# Altium footprint library PCB-PCEIOT.PcbLib: 119 footprints (part 1 of 8)
Each footprint in its own frame and in the unit in brackets; x right, y up, seen from the top. Pads: shape width x height; smd on the part's side, far side on the other; paste and mask are expansions set on the pad; w line width, h text height; cw(c..) or ccw(c..) is an arc to the next point about the centre after c.
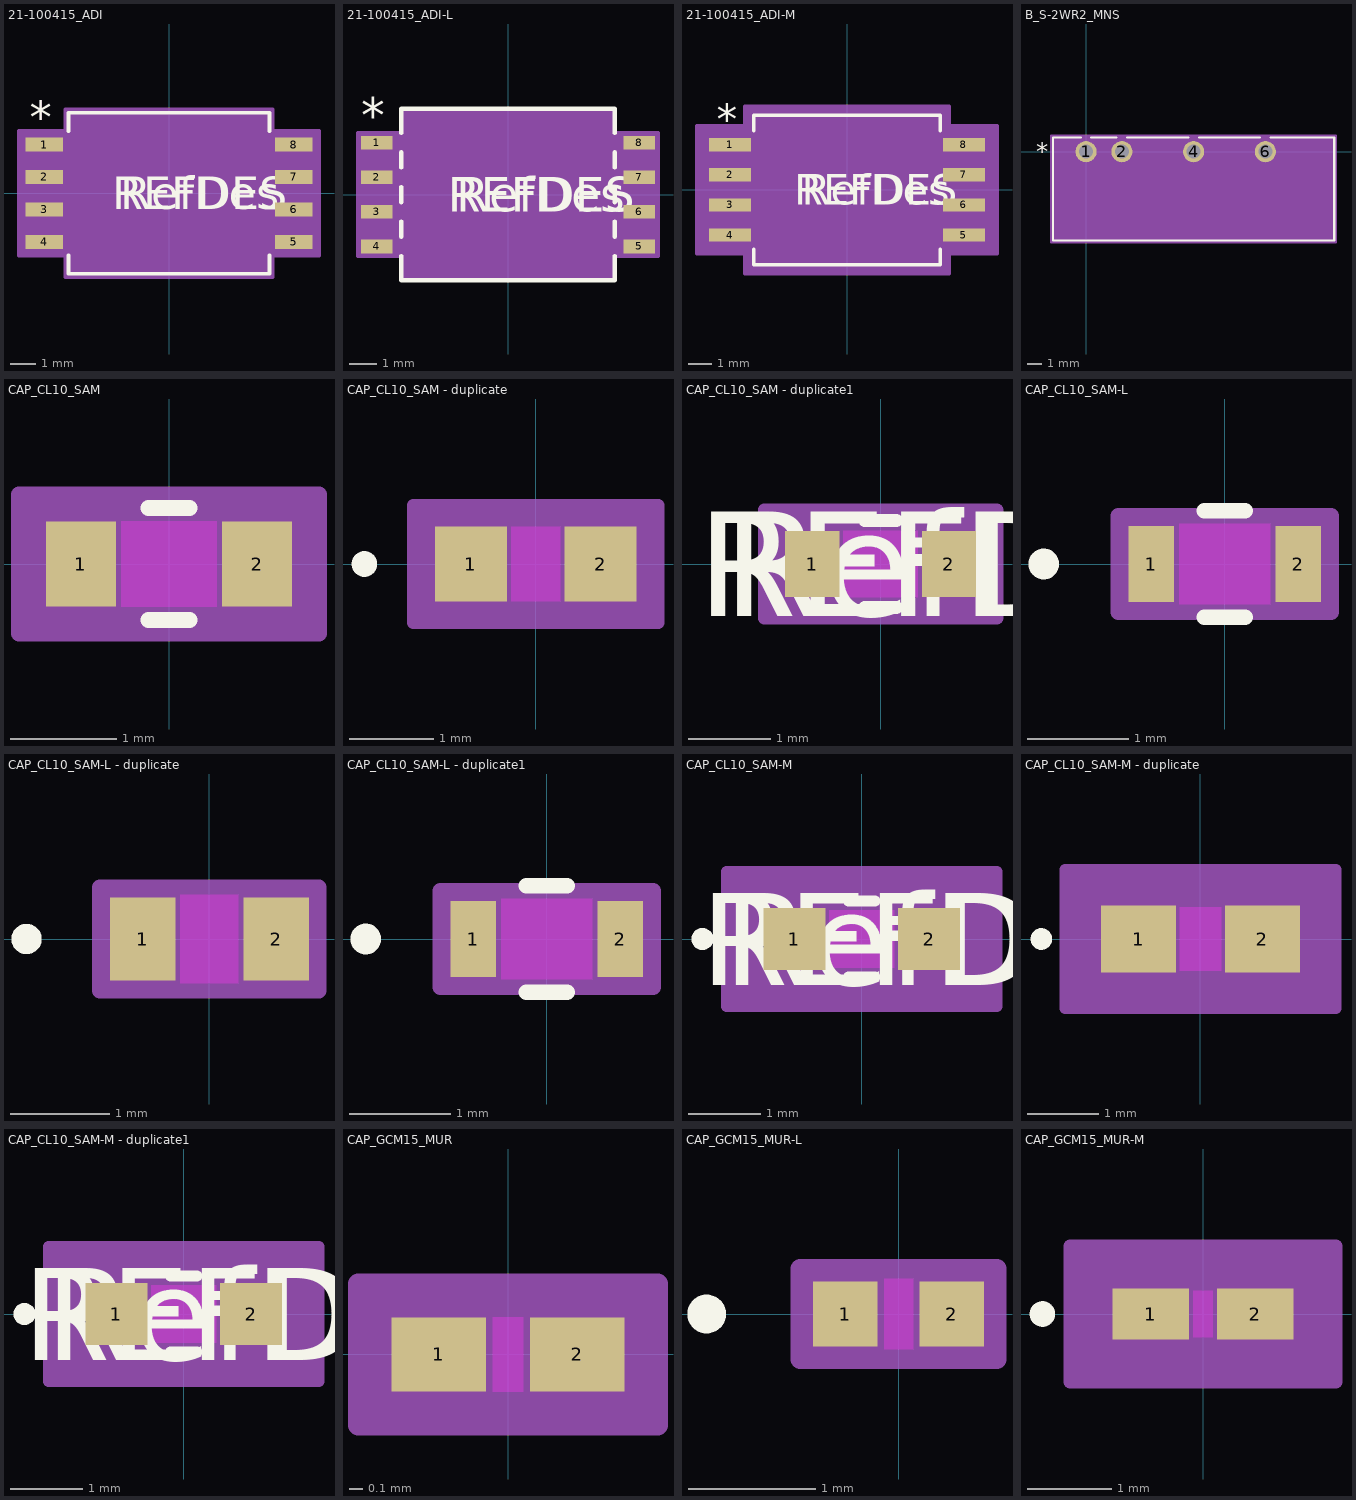
[diagram p0: the footprints below, top view; thin cyan lines are the x and y axes]

## 21-100415_ADI [mil]
pads (8):
  rect 58x22 smd paste+0 mask+0: 1(-192,75) 2(-192,25) 3(-192,-25) 4(-192,-75) 5(192,-75) 6(192,-25) 7(192,25) 8(192,75)
Top Overlay:
  lines w6: -154.5,-95.97 -154.5,-124 154.5,-124 154.5,-95.97 ; -154.5,95.97 -154.5,124 154.5,124 154.5,95.97
  text "RefDes" at -75,-25 h50
  text "*" at -214.5,92 h50
  text "REFDES" at -87.5,-25 h50
Mechanical 13:
  lines w0: -12,119 ccw(c0,119) 12,119
  lines w1: -207,-85 -149.5,-85 -149.5,-65 -207,-65 -207,-85 ; -207,-35 -149.5,-35 -149.5,-15 -207,-15 -207,-35 ; -207,15 -149.5,15 -149.5,35 -207,35 -207,15 ; -207,65 -149.5,65 -149.5,85 -207,85 -207,65 ; -149.5,-119 -149.5,119 149.5,119 149.5,-119 -149.5,-119 ; 149.5,-85 207,-85 207,-65 149.5,-65 149.5,-85 ; 149.5,-35 207,-35 207,-15 149.5,-15 149.5,-35 ; 149.5,15 207,15 207,35 149.5,35 149.5,15 ; 149.5,65 207,65 207,85 149.5,85 149.5,65
  text "RefDes2" at -87.5,-25 h50
  text "*" at -147,66 h50
Mechanical 15:
  region: -159.5,-96 -231,-96 -231,96 -159.5,96 -159.5,129 159.5,129 159.5,96 231,96 231,-96 159.5,-96 159.5,-129 -159.5,-129
  lines w6: -231,-96 -159.5,-96 -159.5,-129 159.5,-129 159.5,-96 231,-96 231,96 159.5,96 159.5,129 -159.5,129 -159.5,96 -231,96 -231,-96
3D body "21-100415_ADI.step": height 104.09, standoff 0, extent -207.01,-119.02 207.01,119.02

## 21-100415_ADI-L [mil]
pads (8):
  rect 46x20 smd paste+0 mask+0: 1(-190,75) 2(-190,25) 3(-190,-25) 4(-190,-75) 5(190,-75) 6(190,-25) 7(190,25) 8(190,75)
Top Overlay:
  lines w6: -154.5,-88.92 -154.5,-124 154.5,-124 154.5,-88.92 ; -154.5,-61.08 -154.5,-38.92 ; -154.5,-11.08 -154.5,11.08 ; -154.5,38.92 -154.5,61.08 ; -154.5,88.92 -154.5,124 154.5,124 154.5,88.92 ; 154.5,-61.08 154.5,-38.92 ; 154.5,-11.08 154.5,11.08 ; 154.5,38.92 154.5,61.08
  text "RefDes" at -75,-25 h50
  text "*" at -212.5,90 h50
  text "REFDES" at -87.5,-25 h50
Mechanical 13:
  lines w0: -12,119 ccw(c0,119) 12,119
  lines w1: -207,-85 -149.5,-85 -149.5,-65 -207,-65 -207,-85 ; -207,-35 -149.5,-35 -149.5,-15 -207,-15 -207,-35 ; -207,15 -149.5,15 -149.5,35 -207,35 -207,15 ; -207,65 -149.5,65 -149.5,85 -207,85 -207,65 ; -149.5,-119 -149.5,119 149.5,119 149.5,-119 -149.5,-119 ; 149.5,-85 207,-85 207,-65 149.5,-65 149.5,-85 ; 149.5,-35 207,-35 207,-15 149.5,-15 149.5,-35 ; 149.5,15 207,15 207,35 149.5,35 149.5,15 ; 149.5,65 207,65 207,85 149.5,85 149.5,65
  text "RefDes2" at -87.5,-25 h50
  text "*" at -147,66 h50
Mechanical 15:
  region: -153.5,-89 -217,-89 -217,89 -153.5,89 -153.5,123 153.5,123 153.5,89 217,89 217,-89 153.5,-89 153.5,-123 -153.5,-123
  lines w6: -217,-89 -153.5,-89 -153.5,-123 153.5,-123 153.5,-89 217,-89 217,89 153.5,89 153.5,123 -153.5,123 -153.5,89 -217,89 -217,-89
3D body "21-100415_ADI.step": height 104.09, standoff 0, extent -207.01,-119.02 207.01,119.02

## 21-100415_ADI-M [mil]
pads (8):
  rect 70x22 smd paste+0 mask+0: 1(-194,75) 2(-194,25) 3(-194,-25) 4(-194,-75) 5(194,-75) 6(194,-25) 7(194,25) 8(194,75)
Top Overlay:
  lines w6: -154.5,-98.3 -154.5,-124 154.5,-124 154.5,-98.3 ; -154.5,98.3 -154.5,124 154.5,124 154.5,98.3
  text "REFDES" at -87.5,-25 h50
  text "*" at -216.5,92 h50
  text "RefDes" at -75,-25 h50
Mechanical 13:
  lines w0: -12,119 ccw(c0,119) 12,119
  lines w1: -207,-85 -207,-65 -149.5,-65 -149.5,-85 -207,-85 ; -207,-35 -207,-15 -149.5,-15 -149.5,-35 -207,-35 ; -207,15 -207,35 -149.5,35 -149.5,15 -207,15 ; -207,65 -207,85 -149.5,85 -149.5,65 -207,65 ; -149.5,-119 149.5,-119 149.5,119 -149.5,119 -149.5,-119 ; 149.5,-85 149.5,-65 207,-65 207,-85 149.5,-85 ; 149.5,-35 149.5,-15 207,-15 207,-35 149.5,-35 ; 149.5,15 149.5,35 207,35 207,15 149.5,15 ; 149.5,65 149.5,85 207,85 207,65 149.5,65
  text "*" at -147,66 h50
  text "RefDes2" at -87.5,-25 h50
Mechanical 15:
  region: -169.5,-106 -249,-106 -249,106 -169.5,106 -169.5,139 169.5,139 169.5,106 249,106 249,-106 169.5,-106 169.5,-139 -169.5,-139
  lines w6: -249,-106 -249,106 -169.5,106 -169.5,139 169.5,139 169.5,106 249,106 249,-106 169.5,-106 169.5,-139 -169.5,-139 -169.5,-106 -249,-106
3D body "21-100415_ADI.step": height 104.09, standoff 0, extent -207.01,-119.02 207.01,119.02

## B_S-2WR2_MNS [mil]
pads (4):
  round 59 hole 39 paste-99999 mask+0: 1(0,0) 2(100,0) 4(300,0) 6(500,0)
Top Overlay:
  lines w6: -14.65,40 -92,40 -92,-248 692,-248 692,40 514.65,40 ; 14.65,40 85.35,40 ; 114.65,40 285.35,40 ; 314.65,40 485.35,40
  text "*" at -139.5,-25 h50
  text ".Designator" at 162.5,-129 h50
Mechanical 13:
  lines w1: -87,-243 687,-243 687,35 -87,35 -87,-243
  text ".Designator" at 162.5,-129 h50
  text "*" at -89.5,-25 h50
Mechanical 15:
  region: 697,-253 -97,-253 -97,45 697,45
  lines w6: -97,-253 -97,45 697,45 697,-253 -97,-253
3D body "B_S-2WR2_MNS.step": height 400, standoff -215.98, extent -87.01,-233.03 687.01,45

## CAP_CL10_SAM [mm]
pads (2):
  rect 0.656x0.8 smd paste+0 mask+0: 1(-0.828,0) 2(0.828,0)
Top Layer keep-out:
  region: -0.449,-0.349 -0.449,0.349 0.449,0.349 0.449,-0.349
Top Overlay:
  lines w0.152: -0.192,-0.527 0.192,-0.527 ; -0.192,0.527 0.192,0.527
  text ".Designator" at -1.46,-0.254 h1.27
Keep-Out Layer:
  region: -0.449,-0.4 -0.449,0.4 0.449,0.4 0.449,-0.4
Mechanical 13:
  lines w0.025: -0.8,-0.4 -0.8,0.4 ; -0.8,-0.4 -0.5,-0.4 -0.5,0.4 -0.8,0.4 ; -0.8,-0.4 0.8,-0.4 ; -0.8,-0.4 -0.8,0.4 ; -0.8,0.4 0.8,0.4 ; 0.8,-0.4 0.5,-0.4 0.5,0.4 0.8,0.4 ; 0.8,-0.4 0.8,0.4 ; 0.8,-0.4 0.8,0.4
Mechanical 15:
  region: 1.41,-0.654 -1.41,-0.654 -1.41,0.654 1.41,0.654
  lines w0.152: -1.41,-0.654 -1.41,0.654 1.41,0.654 1.41,-0.654 -1.41,-0.654
3D body "CAP_CL10_SAM.step": height 0.9, standoff 0, extent -0.8,-0.4 0.8,0.4

## CAP_CL10_SAM - duplicate [mil]
pads (2):
  rect 33.78x35 smd paste+0 mask+0: 1(-30.39,0) 2(30.39,0)
Top Layer keep-out:
  region: -11.5,-15.5 -11.5,15.5 11.5,15.5 11.5,-15.5
Top Overlay:
  circle w6: c-80.28,0 r3
  text ".Designator" at -137.5,-25 h50
Keep-Out Layer:
  region: -11.5,-17.5 -11.5,17.5 11.5,17.5 11.5,-17.5
Mechanical 13:
  circle w1: c-25.39,0 r3
  lines w1: -33.5,-17.5 -33.5,17.5 ; -33.5,-17.5 33.5,-17.5 ; -33.5,-17.5 -13.5,-17.5 -13.5,17.5 -33.5,17.5 ; -33.5,-17.5 -33.5,17.5 ; -33.5,17.5 33.5,17.5 ; 33.5,-17.5 33.5,17.5 ; 33.5,-17.5 33.5,17.5 ; 33.5,-17.5 13.5,-17.5 13.5,17.5 33.5,17.5
  text ".Designator" at -137.5,-25 h50
Mechanical 15:
  region: 57.28,-27.5 -57.28,-27.5 -57.28,27.5 57.28,27.5
  lines w6: -57.28,-27.5 57.28,-27.5 57.28,27.5 -57.28,27.5 -57.28,-27.5
3D body "CAP_CL10_SAM.step": height 35, standoff 0, extent -33.5,-17.48 33.5,17.48

## CAP_CL10_SAM - duplicate1 [mm]
pads (2):
  rect 0.656x0.8 smd paste+0 mask+0: 1(-0.828,0) 2(0.828,0)
Top Layer keep-out:
  region: -0.449,-0.349 -0.449,0.349 0.449,0.349 0.449,-0.349
Top Overlay:
  lines w0.152: -0.192,-0.527 0.192,-0.527 ; -0.192,0.527 0.192,0.527
  text "RefDes" at -1.905,-0.635 h1.27
  text "REFDES" at -2.222,-0.635 h1.27
Keep-Out Layer:
  region: -0.449,-0.4 -0.449,0.4 0.449,0.4 0.449,-0.4
Mechanical 13:
  lines w0.025: -0.8,-0.4 -0.8,0.4 ; -0.8,-0.4 -0.5,-0.4 -0.5,0.4 -0.8,0.4 ; -0.8,-0.4 0.8,-0.4 ; -0.8,-0.4 -0.8,0.4 ; -0.8,0.4 0.8,0.4 ; 0.8,-0.4 0.5,-0.4 0.5,0.4 0.8,0.4 ; 0.8,-0.4 0.8,0.4 ; 0.8,-0.4 0.8,0.4
  text "RefDes2" at -2.222,-0.635 h1.27
Mechanical 15:
  region: 1.41,-0.654 -1.41,-0.654 -1.41,0.654 1.41,0.654
  lines w0.152: -1.41,-0.654 -1.41,0.654 1.41,0.654 1.41,-0.654 -1.41,-0.654
3D body "CAP_CL10_SAM.step": height 0.9, standoff 0, extent -0.8,-0.4 0.8,0.4

## CAP_CL10_SAM-L [mm]
pads (2):
  rect 0.452x0.749 smd paste+0 mask+0: 1(-0.726,0) 2(0.726,0)
Top Layer keep-out:
  region: -0.449,-0.349 -0.449,0.349 0.449,0.349 0.449,-0.349
Top Overlay:
  circle w0.152: c-1.791,0 r0.076
  lines w0.152: -0.204,-0.527 0.204,-0.527 ; -0.204,0.527 0.204,0.527
  text ".Designator" at -1.016,-0.254 h0.64
Keep-Out Layer:
  region: -0.449,-0.4 -0.449,0.4 0.449,0.4 0.449,-0.4
Mechanical 13:
  circle w0: c-0.599,0 r0.076
  lines w0.025: -0.8,-0.4 -0.8,0.4 ; -0.8,-0.4 0.8,-0.4 ; -0.8,-0.4 -0.5,-0.4 -0.5,0.4 -0.8,0.4 ; -0.8,-0.4 -0.8,0.4 ; -0.8,0.4 0.8,0.4 ; 0.8,-0.4 0.8,0.4 ; 0.8,-0.4 0.8,0.4 ; 0.8,-0.4 0.5,-0.4 0.5,0.4 0.8,0.4
Mechanical 15:
  region: 1.054,-0.476 -1.054,-0.476 -1.054,0.476 1.054,0.476
  lines w0.152: -1.054,-0.476 1.054,-0.476 1.054,0.476 -1.054,0.476 -1.054,-0.476
3D body "CAP_CL10_SAM.step": height 0.9, standoff 0, extent -0.8,-0.4 0.8,0.4

## CAP_CL10_SAM-L - duplicate [mm]
pads (2):
  rect 0.658x0.839 smd paste+0 mask+0: 1(-0.672,0) 2(0.672,0)
Top Layer keep-out:
  region: -0.292,-0.394 -0.292,0.394 0.292,0.394 0.292,-0.394
Top Overlay:
  circle w0.152: c-1.839,0 r0.076
  text ".Designator" at -3.492,-0.635 h1.27
Keep-Out Layer:
  region: -0.292,-0.445 -0.292,0.445 0.292,0.445 0.292,-0.445
Mechanical 13:
  circle w0.025: c-0.545,0 r0.076
  lines w0.025: -0.851,-0.445 -0.851,0.445 ; -0.851,-0.445 -0.343,-0.445 -0.343,0.445 -0.851,0.445 ; -0.851,-0.445 0.851,-0.445 ; -0.851,-0.445 -0.851,0.445 ; -0.851,0.445 0.851,0.445 ; 0.851,-0.445 0.343,-0.445 0.343,0.445 0.851,0.445 ; 0.851,-0.445 0.851,0.445 ; 0.851,-0.445 0.851,0.445
  text ".Designator" at -3.492,-0.635 h1.27
Mechanical 15:
  region: 1.102,-0.521 -1.102,-0.521 -1.102,0.521 1.102,0.521
  lines w0.152: -1.102,-0.521 -1.102,0.521 1.102,0.521 1.102,-0.521 -1.102,-0.521
3D body "CAP_CL10_SAM.step": height 0.89, standoff 0, extent -0.851,-0.444 0.851,0.444

## CAP_CL10_SAM-L - duplicate1 [mm]
pads (2):
  rect 0.452x0.749 smd paste+0 mask+0: 1(-0.726,0) 2(0.726,0)
Top Layer keep-out:
  region: -0.449,-0.349 -0.449,0.349 0.449,0.349 0.449,-0.349
Top Overlay:
  circle w0.152: c-1.791,0 r0.076
  lines w0.152: -0.204,-0.527 0.204,-0.527 ; -0.204,0.527 0.204,0.527
Keep-Out Layer:
  region: -0.449,-0.4 -0.449,0.4 0.449,0.4 0.449,-0.4
Mechanical 13:
  circle w0: c-0.599,0 r0.076
  lines w0.025: -0.8,-0.4 -0.8,0.4 ; -0.8,-0.4 -0.5,-0.4 -0.5,0.4 -0.8,0.4 ; -0.8,-0.4 0.8,-0.4 ; -0.8,-0.4 -0.8,0.4 ; -0.8,0.4 0.8,0.4 ; 0.8,-0.4 0.5,-0.4 0.5,0.4 0.8,0.4 ; 0.8,-0.4 0.8,0.4 ; 0.8,-0.4 0.8,0.4
Mechanical 15:
  region: 1.054,-0.476 -1.054,-0.476 -1.054,0.476 1.054,0.476
  lines w0.152: -1.054,-0.476 -1.054,0.476 1.054,0.476 1.054,-0.476 -1.054,-0.476
3D body "CAP_CL10_SAM.step": height 0.9, standoff 0, extent -0.8,-0.4 0.8,0.4

## CAP_CL10_SAM-M [mm]
pads (2):
  rect 0.859x0.851 smd paste+0 mask+0: 1(-0.929,0) 2(0.929,0)
Top Layer keep-out:
  region: -0.449,-0.349 -0.449,0.349 0.449,0.349 0.449,-0.349
Top Overlay:
  circle w0.152: c-2.197,0 r0.076
  lines w0.152: -0.183,-0.527 0.183,-0.527 ; -0.183,0.527 0.183,0.527
  text "REFDES" at -2.222,-0.635 h1.27
  text "RefDes" at -1.905,-0.635 h1.27
Keep-Out Layer:
  region: -0.449,-0.4 -0.449,0.4 0.449,0.4 0.449,-0.4
Mechanical 13:
  circle w0: c-0.802,0 r0.076
  lines w0.025: -0.8,-0.4 -0.8,0.4 ; -0.8,-0.4 0.8,-0.4 ; -0.8,-0.4 -0.5,-0.4 -0.5,0.4 -0.8,0.4 ; -0.8,-0.4 -0.8,0.4 ; -0.8,0.4 0.8,0.4 ; 0.8,-0.4 0.8,0.4 ; 0.8,-0.4 0.8,0.4 ; 0.8,-0.4 0.5,-0.4 0.5,0.4 0.8,0.4
  text "RefDes2" at -2.222,-0.635 h1.27
Mechanical 15:
  region: 1.867,-0.933 -1.867,-0.933 -1.867,0.933 1.867,0.933
  lines w0.152: -1.867,-0.933 1.867,-0.933 1.867,0.933 -1.867,0.933 -1.867,-0.933
3D body "CAP_CL10_SAM.step": height 0.9, standoff 0, extent -0.8,-0.4 0.8,0.4

## CAP_CL10_SAM-M - duplicate [mm]
pads (2):
  rect 1.058x0.939 smd paste+0 mask+0: 1(-0.872,0) 2(0.872,0)
Top Layer keep-out:
  region: -0.292,-0.394 -0.292,0.394 0.292,0.394 0.292,-0.394
Top Overlay:
  circle w0.152: c-2.239,0 r0.076
  text ".Designator" at -3.492,-0.635 h1.27
Keep-Out Layer:
  region: -0.292,-0.445 -0.292,0.445 0.292,0.445 0.292,-0.445
Mechanical 13:
  circle w0.025: c-0.745,0 r0.076
  lines w0.025: -0.851,-0.445 -0.851,0.445 ; -0.851,-0.445 -0.343,-0.445 -0.343,0.445 -0.851,0.445 ; -0.851,-0.445 0.851,-0.445 ; -0.851,-0.445 -0.851,0.445 ; -0.851,0.445 0.851,0.445 ; 0.851,-0.445 0.343,-0.445 0.343,0.445 0.851,0.445 ; 0.851,-0.445 0.851,0.445 ; 0.851,-0.445 0.851,0.445
  text ".Designator" at -3.492,-0.635 h1.27
Mechanical 15:
  region: 1.909,-0.977 -1.909,-0.977 -1.909,0.977 1.909,0.977
  lines w0.152: -1.909,-0.977 -1.909,0.977 1.909,0.977 1.909,-0.977 -1.909,-0.977
3D body "CAP_CL10_SAM.step": height 0.89, standoff 0, extent -0.851,-0.444 0.851,0.444

## CAP_CL10_SAM-M - duplicate1 [mm]
pads (2):
  rect 0.859x0.851 smd paste+0 mask+0: 1(-0.929,0) 2(0.929,0)
Top Layer keep-out:
  region: -0.449,-0.349 -0.449,0.349 0.449,0.349 0.449,-0.349
Top Overlay:
  circle w0.152: c-2.197,0 r0.076
  lines w0.152: -0.183,-0.527 0.183,-0.527 ; -0.183,0.527 0.183,0.527
  text "REFDES" at -2.222,-0.635 h1.27
  text "RefDes" at -1.905,-0.635 h1.27
Keep-Out Layer:
  region: -0.449,-0.4 -0.449,0.4 0.449,0.4 0.449,-0.4
Mechanical 13:
  circle w0: c-0.802,0 r0.076
  lines w0.025: -0.8,-0.4 -0.8,0.4 ; -0.8,-0.4 0.8,-0.4 ; -0.8,-0.4 -0.5,-0.4 -0.5,0.4 -0.8,0.4 ; -0.8,-0.4 -0.8,0.4 ; -0.8,0.4 0.8,0.4 ; 0.8,-0.4 0.8,0.4 ; 0.8,-0.4 0.8,0.4 ; 0.8,-0.4 0.5,-0.4 0.5,0.4 0.8,0.4
  text "RefDes2" at -2.222,-0.635 h1.27
Mechanical 15:
  region: 1.867,-0.933 -1.867,-0.933 -1.867,0.933 1.867,0.933
  lines w0.152: -1.867,-0.933 1.867,-0.933 1.867,0.933 -1.867,0.933 -1.867,-0.933
3D body "CAP_CL10_SAM.step": height 0.9, standoff 0, extent -0.8,-0.4 0.8,0.4

## CAP_GCM15_MUR [mil]
pads (2):
  rect 28x22 smd paste+0 mask+0: 1(-20.5,0) 2(20.5,0)
Top Layer keep-out:
  region: -4.5,-9 -4.5,9 4.5,9 4.5,-9
Top Overlay:
Keep-Out Layer:
  region: -4.5,-11 -4.5,11 4.5,11 4.5,-11
Mechanical 13:
  lines w1: -20.5,-11 -20.5,11 ; -20.5,-11 -6.5,-11 -6.5,11 -20.5,11 ; -20.5,-11 20.5,-11 ; -20.5,-11 -20.5,11 ; -20.5,11 20.5,11 ; 20.5,-11 6.5,-11 6.5,11 20.5,11 ; 20.5,-11 20.5,11 ; 20.5,-11 20.5,11
Mechanical 15:
  region: 44.5,-21 -44.5,-21 -44.5,21 44.5,21
  lines w6: -44.5,-21 -44.5,21 44.5,21 44.5,-21 -44.5,-21
3D body "CAP_GCM15_MUR.step": height 22.01, standoff 0, extent -20.51,-10.98 20.51,10.98

## CAP_GCM15_MUR-L [mil]
pads (2):
  rect 20x20 smd paste+0 mask+0: 1(-16.5,0) 2(16.5,0)
Top Layer keep-out:
  region: -4.5,-9 -4.5,9 4.5,9 4.5,-9
Top Overlay:
  circle w6: c-59.5,0 r3
Keep-Out Layer:
  region: -4.5,-11 -4.5,11 4.5,11 4.5,-11
Mechanical 13:
  circle w1: c-11.5,0 r3
  lines w1: -20.5,-11 -20.5,11 ; -20.5,-11 -6.5,-11 -6.5,11 -20.5,11 ; -20.5,-11 20.5,-11 ; -20.5,-11 -20.5,11 ; -20.5,11 20.5,11 ; 20.5,-11 6.5,-11 6.5,11 20.5,11 ; 20.5,-11 20.5,11 ; 20.5,-11 20.5,11
Mechanical 15:
  region: 30.5,-14 -30.5,-14 -30.5,14 30.5,14
  lines w6: -30.5,-14 -30.5,14 30.5,14 30.5,-14 -30.5,-14
3D body "CAP_GCM15_MUR.step": height 22.01, standoff 0, extent -20.51,-10.98 20.51,10.98

## CAP_GCM15_MUR-M [mil]
pads (2):
  rect 36x24 smd paste+0 mask+0: 1(-24.5,0) 2(24.5,0)
Top Layer keep-out:
  region: -4.5,-9 -4.5,9 4.5,9 4.5,-9
Top Overlay:
  circle w6: c-75.5,0 r3
Keep-Out Layer:
  region: -4.5,-11 -4.5,11 4.5,11 4.5,-11
Mechanical 13:
  circle w1: c-19.5,0 r3
  lines w1: -20.5,-11 -20.5,11 ; -20.5,-11 -6.5,-11 -6.5,11 -20.5,11 ; -20.5,-11 20.5,-11 ; -20.5,-11 -20.5,11 ; -20.5,11 20.5,11 ; 20.5,-11 6.5,-11 6.5,11 20.5,11 ; 20.5,-11 20.5,11 ; 20.5,-11 20.5,11
Mechanical 15:
  region: 62.5,-32 -62.5,-32 -62.5,32 62.5,32
  lines w6: -62.5,-32 -62.5,32 62.5,32 62.5,-32 -62.5,-32
3D body "CAP_GCM15_MUR.step": height 22.01, standoff 0, extent -20.51,-10.98 20.51,10.98